# Altium footprint library Connectors.PcbLib: 177 footprints (part 10 of 12)
Each footprint in its own frame and in the unit in brackets; x right, y up, seen from the top. Pads: shape width x height; smd on the part's side, far side on the other; paste and mask are expansions set on the pad; w line width, h text height; cw(c..) or ccw(c..) is an arc to the next point about the centre after c.
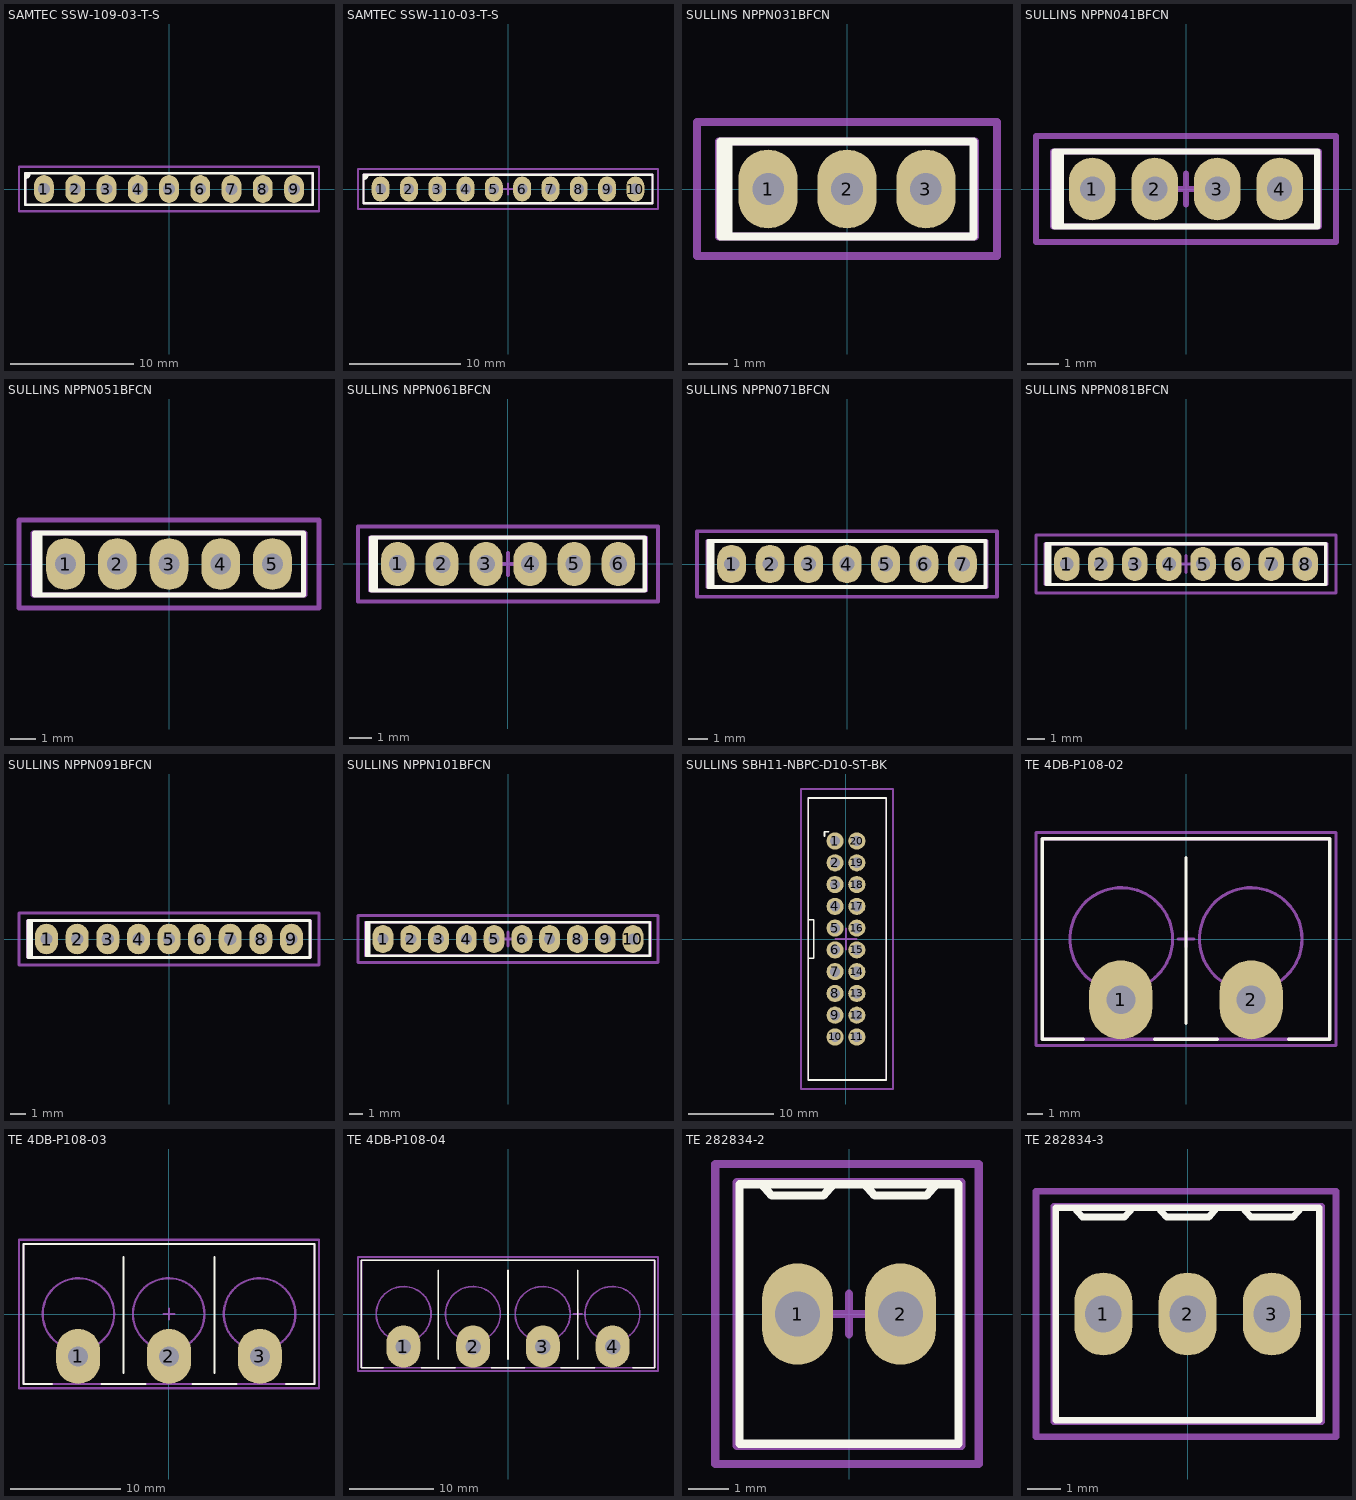
[diagram p9: the footprints below, top view; thin cyan lines are the x and y axes]

## SAMTEC SSW-109-03-T-S [mm]
height 8.51
pads (9):
  oval 1.6x2.25 hole 0.95: 1(-10.16,0) 2(-7.62,0) 3(-5.08,0) 4(-2.54,0) 5(0,0) 6(2.54,0) 7(5.08,0) 8(7.62,0) 9(10.16,0)
Top Overlay:
  region: -11.69,1.27 -11.35,1.27 -11.35,1.1 -11.55,0.9 -11.69,0.9
  lines w0.2: -11.69,0.9 ccw(c-11.69,1.24) -11.35,1.24 -11.35,1.27 ; -11.69,-1.27 11.69,-1.27 11.69,1.27 -11.69,1.27 -11.69,-1.27
Mechanical 13:
  lines w0.2: -11.69,-1.3 -11.69,1.3 11.69,1.3 11.69,-1.3 -11.69,-1.3
Mechanical 15:
  lines w0.2: -0.5,0 0.5,0 ; 0,-0.5 0,0.5 ; -12.19,-1.8 12.19,-1.8 12.19,1.8 -12.19,1.8 -12.19,-1.8
3D body "Samtec-SSW-109-03-T-S.STEP": height 8.51, standoff -10.01, extent -11.684,-1.206 11.684,1.207

## SAMTEC SSW-110-03-T-S [mm]
height 8.51
pads (10):
  oval 1.6x2.25 hole 0.95: 1(-11.43,0) 2(-8.89,0) 3(-6.35,0) 4(-3.81,0) 5(-1.27,0) 6(1.27,0) 7(3.81,0) 8(6.35,0) 9(8.89,0) 10(11.43,0)
Top Overlay:
  region: -12.96,1.27 -12.62,1.27 -12.62,1.1 -12.82,0.9 -12.96,0.9
  lines w0.2: -12.96,0.9 ccw(c-12.96,1.24) -12.62,1.24 -12.62,1.27 ; -12.96,-1.27 12.96,-1.27 12.96,1.27 -12.96,1.27 -12.96,-1.27
Mechanical 13:
  lines w0.2: -12.96,-1.3 -12.96,1.3 12.96,1.3 12.96,-1.3 -12.96,-1.3
Mechanical 15:
  lines w0.2: -0.5,0 0.5,0 ; 0,-0.5 0,0.5 ; -13.46,-1.8 13.46,-1.8 13.46,1.8 -13.46,1.8 -13.46,-1.8
3D body "Samtec-SSW-110-03-T-S.STEP": height 8.51, standoff -10.01, extent -12.954,-1.206 12.954,1.207

## SULLINS NPPN031BFCN [mm]
height 4.4
pads (3):
  oval 1.5x2 hole 0.8: 1(-2,0) 2(0,0) 3(2,0)
Top Overlay:
  lines w0.2: -3,-1.2 -3,1.2 ; -3.2,-1.2 3.2,-1.2 3.2,1.2 -3.2,1.2 -3.2,-1.2
Mechanical 1:
  lines w0.2: -3.25,-1.2 3.2,-1.2 3.25,-1.2 3.25,1.2 -3.25,1.2 -3.25,-1.2
Mechanical 15:
  lines w0.2: -0.5,0 0.5,0 ; 0,-0.5 0,0.5 ; -3.8,-1.7 3.8,-1.7 3.8,1.7 -3.8,1.7 -3.8,-1.7
3D body "Sullins NPPN031BFCN-RC.STEP": height 4.41, standoff -2.39, extent -3.25,-1.2 3.25,1.2

## SULLINS NPPN041BFCN [mm]
height 4.4
pads (4):
  oval 1.5x2 hole 0.8: 1(-3,0) 2(-1,0) 3(1,0) 4(3,0)
Top Overlay:
  lines w0.2: -4,-1.2 -4,1.2 ; -4.2,-1.2 -4.2,1.2 4.2,1.2 4.2,-1.2 -4.2,-1.2
Mechanical 1:
  lines w0.2: 4.25,-1.2 4.25,1.2 -4.25,1.2 -4.25,-1.2 4.25,-1.2
Mechanical 15:
  lines w0.2: -0.5,0 0.5,0 ; 0,-0.5 0,0.5 ; -4.8,-1.7 -4.8,1.7 4.8,1.7 4.8,-1.7 -4.8,-1.7
3D body "Sullins NPPN041BFCN-RC.STEP": height 4.41, standoff -2.39, extent -4.25,-1.2 4.25,1.2

## SULLINS NPPN051BFCN [mm]
height 4.4
pads (5):
  oval 1.5x2 hole 0.8: 1(-4,0) 2(-2,0) 3(0,0) 4(2,0) 5(4,0)
Top Overlay:
  lines w0.2: -5,-1.2 -5,1.2 ; -5.2,-1.2 -5.2,1.2 5.2,1.2 5.2,-1.2 -5.2,-1.2
Mechanical 1:
  lines w0.2: -5.25,-1.2 -5.25,1.2 5.25,1.2 5.25,-1.2 -5.25,-1.2
Mechanical 15:
  lines w0.2: -0.5,0 0.5,0 ; 0,-0.5 0,0.5 ; -5.8,-1.7 -5.8,1.7 5.8,1.7 5.8,-1.7 -5.8,-1.7
3D body "Sullins NPPN051BFCN-RC.STEP": height 4.41, standoff -2.39, extent -5.25,-1.2 5.25,1.2

## SULLINS NPPN061BFCN [mm]
height 4.4
pads (6):
  oval 1.5x2 hole 0.8: 1(-5,0) 2(-3,0) 3(-1,0) 4(1,0) 5(3,0) 6(5,0)
Top Overlay:
  lines w0.2: -6,-1.2 -6,1.2 ; -6.2,-1.2 -6.2,1.2 6.2,1.2 6.2,-1.2 -6.2,-1.2
Mechanical 1:
  lines w0.2: -6.25,-1.2 -6.25,1.2 6.25,1.2 6.25,-1.2 -6.25,-1.2
Mechanical 15:
  lines w0.2: -0.5,0 0.5,0 ; 0,-0.5 0,0.5 ; -6.8,-1.7 -6.8,1.7 6.8,1.7 6.8,-1.7 -6.8,-1.7
3D body "Sullins NPPN061BFCN-RC.STEP": height 4.41, standoff -2.39, extent -6.25,-1.2 6.25,1.2

## SULLINS NPPN071BFCN [mm]
height 4.4
pads (7):
  oval 1.5x2 hole 0.8: 1(-6,0) 2(-4,0) 3(-2,0) 4(0,0) 5(2,0) 6(4,0) 7(6,0)
Top Overlay:
  lines w0.2: -7,-1.2 -7,1.2 ; -7.2,-1.2 -7.2,1.2 7.2,1.2 7.2,-1.2 -7.2,-1.2
Mechanical 1:
  lines w0.2: -7.25,-1.2 -7.25,1.2 7.25,1.2 7.25,-1.2 -7.25,-1.2
Mechanical 15:
  lines w0.2: -0.5,0 0.5,0 ; 0,-0.5 0,0.5 ; -7.8,-1.7 -7.8,1.7 7.8,1.7 7.8,-1.7 -7.8,-1.7
3D body "Sullins NPPN071BFCN-RC.STEP": height 4.41, standoff -2.39, extent -7.25,-1.2 7.25,1.2

## SULLINS NPPN081BFCN [mm]
height 4.4
pads (8):
  oval 1.5x2 hole 0.8: 1(-7,0) 2(-5,0) 3(-3,0) 4(-1,0) 5(1,0) 6(3,0) 7(5,0) 8(7,0)
Top Overlay:
  lines w0.2: -8,-1.2 -8,1.2 ; -8.2,-1.2 8.2,-1.2 8.2,1.2 -8.2,1.2 -8.2,-1.2
Mechanical 1:
  lines w0.2: -8.25,-1.2 8.25,-1.2 8.25,1.2 -8.25,1.2 -8.25,-1.2
Mechanical 15:
  lines w0.2: -0.5,0 0.5,0 ; 0,-0.5 0,0.5 ; -8.8,-1.7 8.8,-1.7 8.8,1.7 -8.8,1.7 -8.8,-1.7
3D body "Sullins NPPN081BFCN-RC.STEP": height 4.41, standoff -2.39, extent -8.25,-1.2 8.25,1.2

## SULLINS NPPN091BFCN [mm]
height 4.4
pads (9):
  oval 1.5x2 hole 0.8: 1(-8,0) 2(-6,0) 3(-4,0) 4(-2,0) 5(0,0) 6(2,0) 7(4,0) 8(6,0) 9(8,0)
Top Overlay:
  lines w0.2: -9,-1.2 -9,1.2 ; -9.2,-1.2 -9.2,1.2 9.2,1.2 9.2,-1.2 -9.2,-1.2
Mechanical 1:
  lines w0.2: 9.25,-1.2 9.25,1.2 ; 9.25,-1.2 -9.25,-1.2 -9.25,1.2 9.25,1.2
Mechanical 15:
  lines w0.2: -0.5,0 0.5,0 ; 0,-0.5 0,0.5 ; -9.8,-1.7 -9.8,1.7 9.8,1.7 9.8,-1.7 -9.8,-1.7
3D body "Sullins NPPN091BFCN-RC.STEP": height 4.41, standoff -2.39, extent -9.25,-1.2 9.25,1.2

## SULLINS NPPN101BFCN [mm]
height 4.4
pads (10):
  oval 1.5x2 hole 0.8: 1(-9,0) 2(-7,0) 3(-5,0) 4(-3,0) 5(-1,0) 6(1,0) 7(3,0) 8(5,0) 9(7,0) 10(9,0)
Top Overlay:
  lines w0.2: -10,-1.2 -10,1.2 ; -10.2,-1.2 10.2,-1.2 10.2,1.2 -10.2,1.2 -10.2,-1.2
Mechanical 1:
  lines w0.2: -10.25,-1.2 10.25,-1.2 10.25,1.2 -10.25,1.2 -10.25,-1.2
Mechanical 15:
  lines w0.2: -0.5,0 0.5,0 ; 0,-0.5 0,0.5 ; -10.8,-1.7 -10.8,1.7 10.8,1.7 10.8,-1.7 -10.8,-1.7
3D body "Sullins NPPN101BFCN-RC.STEP": height 4.41, standoff -2.39, extent -10.25,-1.2 10.25,1.2

## SULLINS SBH11-NBPC-D10-ST-BK [mm]
height 9.1
pads (20):
  round 2 hole 1.2: 1(-1.27,11.43) 2(-1.27,8.89) 3(-1.27,6.35) 4(-1.27,3.81) 5(-1.27,1.27) 6(-1.27,-1.27) 7(-1.27,-3.81) 8(-1.27,-6.35) 9(-1.27,-8.89) 10(-1.27,-11.43) 11(1.27,-11.43) 12(1.27,-8.89) 13(1.27,-6.35) 14(1.27,-3.81) 15(1.27,-1.27) 16(1.27,1.27) 17(1.27,3.81) 18(1.27,6.35) 19(1.27,8.89) 20(1.27,11.43)
Top Overlay:
  lines w0.2: -4.4,-2.25 -3.75,-2.25 -3.75,2.25 -4.4,2.25 ; -2.5,12 -2.5,12.5 -2,12.5 ; -4.4,-16.45 -4.4,16.45 4.7,16.45 4.7,-16.45 -4.4,-16.45
Mechanical 1:
  lines w0.2: -4.4,-16.45 4.7,-16.45 4.7,16.45 -4.4,16.45 -4.4,-16.45
Mechanical 15:
  lines w0.2: -1.25,0 1.25,0 ; 0,-1.25 0,1.25 ; -5.25,-17.5 -5.25,17.5 5.5,17.5 5.5,-17.5 -5.25,-17.5
3D body "2x10 2.54mm Box Header.STEP": height 9.1, standoff -3, extent -4.4,-16.45 4.7,16.45

## TE 4DB-P108-02 [mm] "Assembly, Dual Barrier 4DB P108"
height 13.5
pads (2):
  oval 4x5 hole 1.829: 1(-4.127,-3.85) 2(4.127,-3.85)
Top Overlay:
  lines w0.2: -6.5,-6.35 -9.1,-6.35 -9.1,6.35 9.1,6.35 9.1,-6.35 6.5,-6.35 ; -2,-6.35 2,-6.35 ; 0,-5.35 0,5.15
Mechanical 1:
  circle w0.2: c4.1,0 r3.25
  circle w0.2: c-4.1,0 r3.25
  lines w0.2: -9.081,-6.35 -9.081,6.35 9.081,6.35 9.081,-6.35 -9.081,-6.35
Mechanical 15:
  lines w0.2: -0.5,0 0.5,0 ; 0,-0.5 0,0.5 ; -9.5,-6.75 9.5,-6.75 9.5,6.75 -9.5,6.75 -9.5,-6.75
3D body "TE 4DB-P108-02.STEP": height 14.48, standoff -4.06, extent -9.081,-6.35 9.081,6.35

## TE 4DB-P108-03 [mm] "Assembly, Dual Barrier 4DB P108"
height 13.5
pads (3):
  oval 4x5 hole 1.829: 1(-8.255,-3.85) 2(0,-3.85) 3(8.256,-3.85)
Top Overlay:
  lines w0.2: -10.627,-6.35 -13.227,-6.35 -13.227,6.35 13.228,6.35 13.228,-6.35 10.628,-6.35 ; -6.128,-6.35 -2.127,-6.35 ; -4.127,-5.35 -4.127,5.15 ; 2.128,-6.35 6.129,-6.35 ; 4.129,-5.35 4.129,5.15
Mechanical 1:
  circle w0.2: c8.229,0 r3.25
  circle w0.2: c-8.227,0 r3.25
  circle w0.2: c-0.028,0 r3.25
  lines w0.2: -13.208,-6.35 13.209,-6.35 13.209,6.35 -13.208,6.35 -13.208,-6.35
Mechanical 15:
  lines w0.2: -0.499,0 0.5,0 ; 0.001,-0.5 0.001,0.5 ; -13.627,-6.75 -13.627,6.75 13.628,6.75 13.628,-6.75 -13.627,-6.75
3D body "TE 4DB-P108-03.STEP": height 14.47, standoff -4.06, extent -13.208,-6.35 13.208,6.35

## TE 4DB-P108-04 [mm] "Assembly, Dual Barrier 4DB P108"
height 13.5
pads (4):
  oval 4x5 hole 1.829: 1(-12.383,-3.85) 2(-4.127,-3.85) 3(4.127,-3.85) 4(12.383,-3.85)
Top Overlay:
  lines w0.2: -14.755,-6.35 -17.355,-6.35 -17.355,6.35 17.355,6.35 17.355,-6.35 14.755,-6.35 ; -10.255,-6.35 -6.255,-6.35 ; -8.255,-5.35 -8.255,5.15 ; -2,-6.35 2,-6.35 ; 0,-5.35 0,5.15 ; 6.255,-6.35 10.255,-6.35 ; 8.255,-5.35 8.255,5.15
Mechanical 1:
  circle w0.2: c-12.355,0 r3.25
  circle w0.2: c-4.155,0 r3.25
  circle w0.2: c4.1,0 r3.25
  circle w0.2: c12.355,0 r3.25
  lines w0.2: -17.336,-6.35 -17.336,6.35 17.336,6.35 17.336,-6.35 -17.336,-6.35
Mechanical 15:
  lines w0.2: 7.755,0 8.755,0 ; 8.255,-0.5 8.255,0.5 ; -17.755,-6.75 17.755,-6.75 17.755,6.75 -17.755,6.75 -17.755,-6.75
3D body "TE 4DB-P108-04.STEP": height 14.47, standoff -4.06, extent -17.336,-6.35 17.335,6.35

## TE 282834-2 [mm]
height 10
pads (2):
  oval 1.75x2.5 hole 1.1: 1(-1.27,0) 2(1.27,0)
Top Overlay:
  lines w0.2: -2.159,3.2 -1.905,2.921 -0.635,2.921 -0.381,3.2 ; 0.381,3.2 0.635,2.921 1.905,2.921 2.159,3.2 ; -2.7,-3.2 -2.6,-3.2 2.7,-3.2 2.7,3.2 -2.7,3.2 -2.7,-3.2
Mechanical 13:
  lines w0.2: -2.77,-3.25 -2.77,3.25 2.77,3.25 2.77,-3.25 -2.77,-3.25
Mechanical 15:
  lines w0.2: -0.5,0 0.5,0 ; 0,-0.5 0,0.5 ; -3.3,-3.7 3.2,-3.7 3.2,-2.9 3.2,3.7 -3.3,3.7 -3.3,-3.3 -3.3,-3.7
3D body "TE Term Block 2port 282834-2-c-3d.STEP": height 10, standoff -3.4, extent -2.77,-3.25 2.77,3.25

## TE 282834-3 [mm]
height 10
pads (3):
  oval 1.75x2.5 hole 1.1: 1(-2.54,0) 2(0,0) 3(2.54,0)
Top Overlay:
  lines w0.2: -3.429,3.2 -3.175,2.921 -1.905,2.921 -1.651,3.2 ; -0.889,3.2 -0.635,2.921 0.635,2.921 0.889,3.2 ; 1.651,3.2 1.905,2.921 3.175,2.921 3.429,3.2 ; -3.97,-3.2 -3.87,-3.2 3.97,-3.2 3.97,3.2 -3.97,3.2 -3.97,-3.2
Mechanical 13:
  lines w0.2: -4.04,-3.25 -4.04,3.25 4.04,3.25 4.04,-3.25 -4.04,-3.25
Mechanical 15:
  lines w0.2: -0.5,0 0.5,0 ; 0,-0.5 0,0.5 ; -4.57,-3.7 4.47,-3.7 4.47,-2.9 4.47,3.7 -4.57,3.7 -4.57,-3.3 -4.57,-3.7
3D body "TE Term Block 3port 282834-3-c-3d.STEP": height 10, standoff -3.4, extent -4.04,-3.25 4.04,3.25